# Altium footprint library custom-case.PcbLib: 380 footprints (part 5 of 24)
Each footprint in its own frame and in the unit in brackets; x right, y up, seen from the top. Pads: shape width x height; smd on the part's side, far side on the other; paste and mask are expansions set on the pad; w line width, h text height; cw(c..) or ccw(c..) is an arc to the next point about the centre after c.
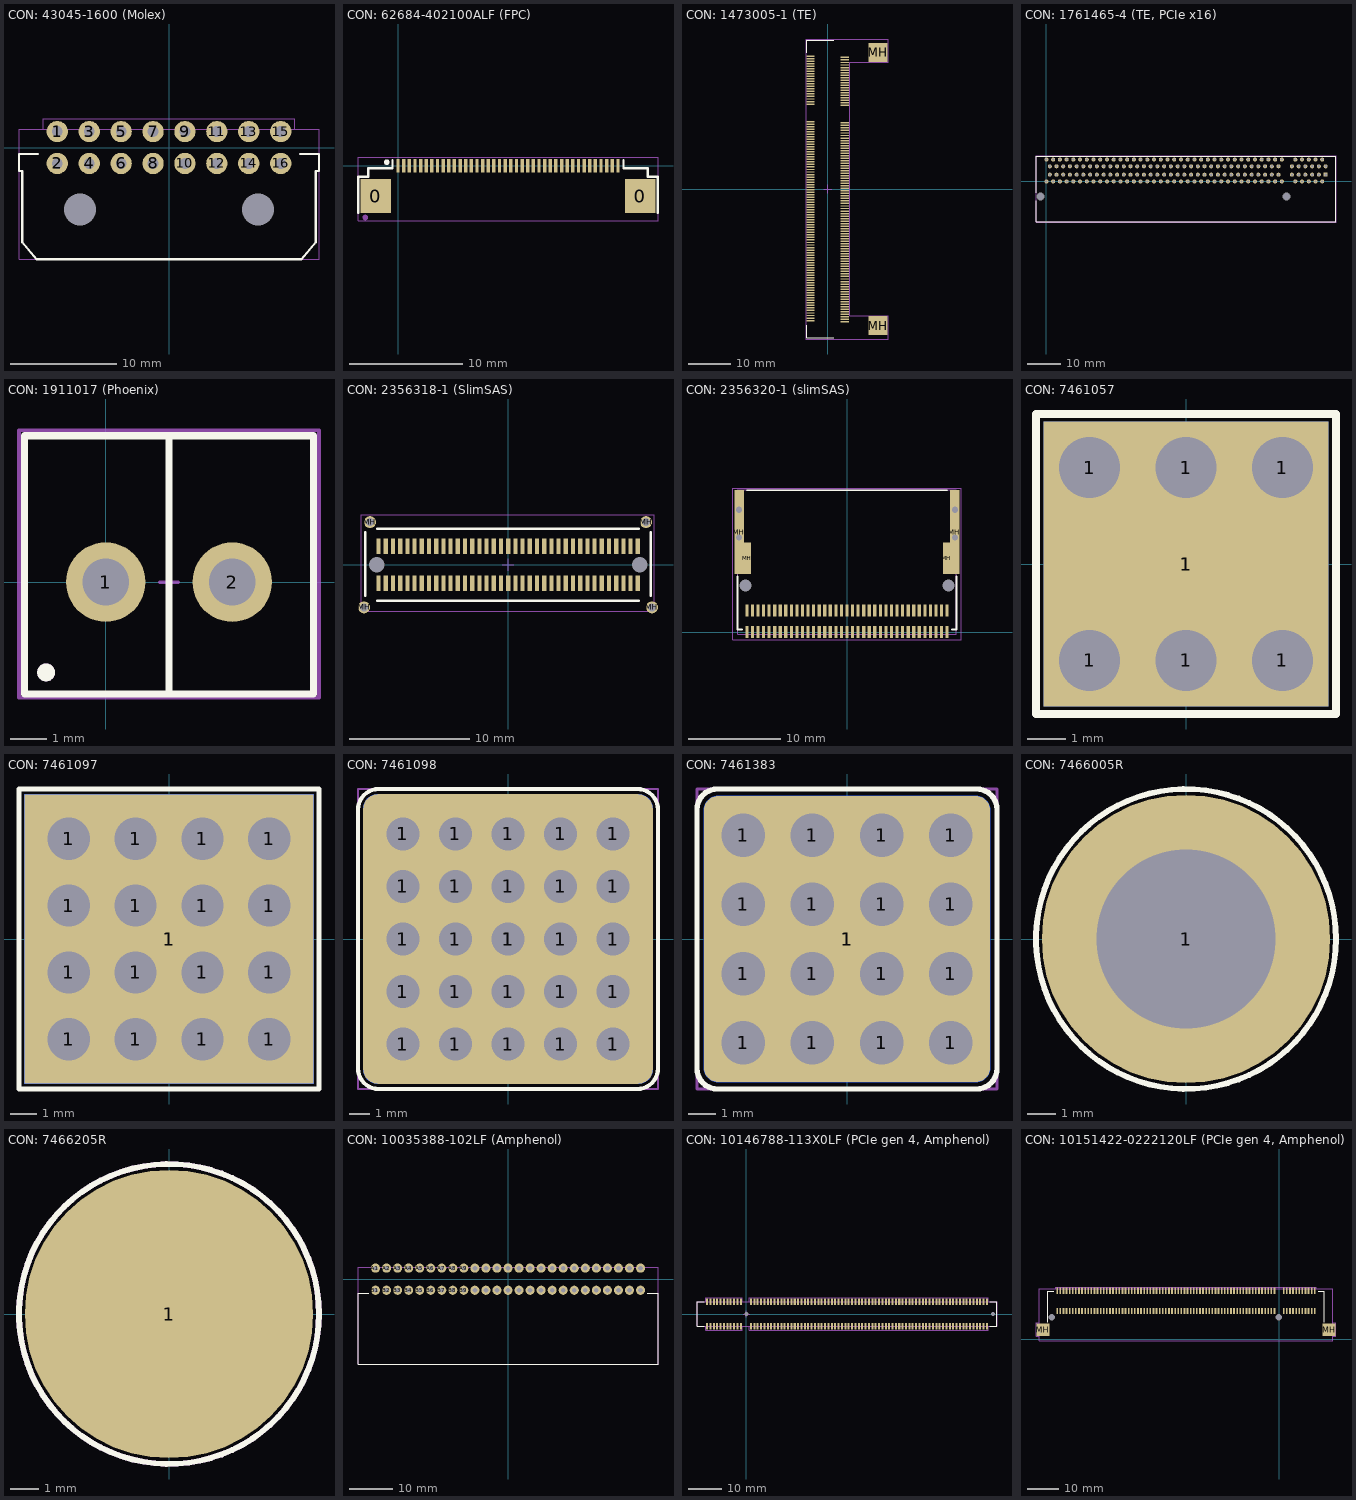
[diagram p4: the footprints below, top view; thin cyan lines are the x and y axes]

## CON: 43045-1600 (Molex) [mm]
pads (18):
  round 2 hole 1: 1(-10.5,1.5) 2(-10.5,-1.5) 3(-7.5,1.5) 4(-7.5,-1.5) 5(-4.5,1.5) 6(-4.5,-1.5) 7(-1.5,1.5) 8(-1.5,-1.5) 9(1.5,1.5) 10(1.5,-1.5) 11(4.5,1.5) 12(4.5,-1.5) 13(7.5,1.5) 14(7.5,-1.5) 15(10.5,1.5) 16(10.5,-1.5)
  round 0 hole 3: MH(-8.35,-5.82) MH(8.35,-5.82)
Top Overlay:
  lines w0.2: -12.3,-0.6 -14.1,-0.6 -14.1,-2.2 -13.8,-2.2 -13.8,-8.9 -12.45,-10.5 12.45,-10.5 13.8,-8.9 13.8,-2.2 14.1,-2.2 14.1,-0.6 12.3,-0.6
Top Assy:
  lines w0.1: -14.1,-10.5 -14.1,1.7 14.1,1.7 14.1,-10.5 -14.1,-10.5
Size Area:
  lines w0.1: -14.1,-10.5 -14.1,1.7 -11.8,1.7 -11.8,2.7 11.8,2.7 11.8,1.7 14.1,1.7 14.1,-10.5 -14.1,-10.5
3D body "430451600 v1.step": height 8.83, standoff -3.12, extent -14.075,-10.5 14.075,1.74

## CON: 62684-402100ALF (FPC) [mm]
pads (44):
  rect 2.7x3 smd: 0(-1.975,-2.7) 0(21.475,-2.7)
  rect 0.3x1.2 smd: 1(0,0) 2(0.5,0) 3(1,0) 4(1.5,0) 5(2,0) 6(2.5,0) 7(3,0) 8(3.5,0) 9(4,0) 10(4.5,0) 11(5,0) 12(5.5,0) 13(6,0) 14(6.5,0) 15(7,0) 16(7.5,0) 17(8,0) 18(8.5,0) 19(9,0) 20(9.5,0) 21(10,0) 22(10.5,0) 23(11,0) 24(11.5,0) 25(12,0) 26(12.5,0) 27(13,0) 28(13.5,0) 29(14,0) 30(14.5,0) 31(15,0) 32(15.5,0) 33(16,0) 34(16.5,0) 35(17,0) 36(17.5,0) 37(18,0) 38(18.5,0) 39(19,0) 40(19.5,0)
  round 0.5 on Mech1: ""(-2.9,-4.6)
  round 0.5 on Top Overlay: ""(-1,0.3)
Top Overlay:
  lines w0.2: -3.525,-4.2 -3.525,-1 -2.65,-1 -2.65,-0.225 -0.5,-0.225 -0.5,0.5 ; 20,0.5 20,-0.225 22.15,-0.225 22.15,-1 23.025,-1 23.025,-4.2
Size Area:
  lines w0.1: -3.55,-4.9 -3.55,0.75 23.05,0.75 23.05,-4.9 -3.55,-4.9
3D body "62684-402100ALF.SLDPRT": height 2.05, standoff 0, extent -3,-5.4 22.5,0.2

## CON: 1473005-1 (TE) [mm] "SODIMM DDR2, 200 pins"
pads (202):
  rect 2x0.35 smd: 1(-4.1,31.65) 2(4.1,31.35) 3(-4.1,31.05) 4(4.1,30.75) 5(-4.1,30.45) 6(4.1,30.15) 7(-4.1,29.85) 8(4.1,29.55) 9(-4.1,29.25) 10(4.1,28.95) 11(-4.1,28.65) 12(4.1,28.35) 13(-4.1,28.05) 14(4.1,27.75) 15(-4.1,27.45) 16(4.1,27.15) 17(-4.1,26.85) 18(4.1,26.55) 19(-4.1,26.25) 20(4.1,25.95) 21(-4.1,25.65) 22(4.1,25.35) 23(-4.1,25.05) 24(4.1,24.75) 25(-4.1,24.45) 26(4.1,24.15) 27(-4.1,23.85) 28(4.1,23.55) 29(-4.1,23.25) 30(4.1,22.95) 31(-4.1,22.65) 32(4.1,22.35) 33(-4.1,22.05) 34(4.1,21.75) 35(-4.1,21.45) 36(4.1,21.15) 37(-4.1,20.85) 38(4.1,20.55) 39(-4.1,20.25) 40(4.1,19.95) 41(-4.1,16.05) 42(4.1,15.75) 43(-4.1,15.45) 44(4.1,15.15) 45(-4.1,14.85) 46(4.1,14.55) 47(-4.1,14.25) 48(4.1,13.95) 49(-4.1,13.65) 50(4.1,13.35) 51(-4.1,13.05) 52(4.1,12.75) 53(-4.1,12.45) 54(4.1,12.15) 55(-4.1,11.85) 56(4.1,11.55) 57(-4.1,11.25) 58(4.1,10.95) 59(-4.1,10.65) 60(4.1,10.35) 61(-4.1,10.05) 62(4.1,9.75) 63(-4.1,9.45) 64(4.1,9.15) 65(-4.1,8.85) 66(4.1,8.55) 67(-4.1,8.25) 68(4.1,7.95) 69(-4.1,7.65) 70(4.1,7.35) 71(-4.1,7.05) 72(4.1,6.75) 73(-4.1,6.45) 74(4.1,6.15) 75(-4.1,5.85) 76(4.1,5.55) 77(-4.1,5.25) 78(4.1,4.95) 79(-4.1,4.65) 80(4.1,4.35) 81(-4.1,4.05) 82(4.1,3.75) 83(-4.1,3.45) 84(4.1,3.15) 85(-4.1,2.85) 86(4.1,2.55) 87(-4.1,2.25) 88(4.1,1.95) 89(-4.1,1.65) 90(4.1,1.35) 91(-4.1,1.05) 92(4.1,0.75) 93(-4.1,0.45) 94(4.1,0.15) 95(-4.1,-0.15) 96(4.1,-0.45) 97(-4.1,-0.75) 98(4.1,-1.05) 99(-4.1,-1.35) 100(4.1,-1.65) 101(-4.1,-1.95) 102(4.1,-2.25) 103(-4.1,-2.55) 104(4.1,-2.85) 105(-4.1,-3.15) 106(4.1,-3.45) 107(-4.1,-3.75) 108(4.1,-4.05) 109(-4.1,-4.35) 110(4.1,-4.65) 111(-4.1,-4.95) 112(4.1,-5.25) 113(-4.1,-5.55) 114(4.1,-5.85) 115(-4.1,-6.15) 116(4.1,-6.45) 117(-4.1,-6.75) 118(4.1,-7.05) 119(-4.1,-7.35) 120(4.1,-7.65) 121(-4.1,-7.95) 122(4.1,-8.25) 123(-4.1,-8.55) 124(4.1,-8.85) 125(-4.1,-9.15) 126(4.1,-9.45) 127(-4.1,-9.75) 128(4.1,-10.05) 129(-4.1,-10.35) 130(4.1,-10.65) 131(-4.1,-10.95) 132(4.1,-11.25) 133(-4.1,-11.55) 134(4.1,-11.85) 135(-4.1,-12.15) 136(4.1,-12.45) 137(-4.1,-12.75) 138(4.1,-13.05) 139(-4.1,-13.35) 140(4.1,-13.65) 141(-4.1,-13.95) 142(4.1,-14.25) 143(-4.1,-14.55) 144(4.1,-14.85) 145(-4.1,-15.15) 146(4.1,-15.45) 147(-4.1,-15.75) 148(4.1,-16.05) 149(-4.1,-16.35) 150(4.1,-16.65) 151(-4.1,-16.95) 152(4.1,-17.25) 153(-4.1,-17.55) 154(4.1,-17.85) 155(-4.1,-18.15) 156(4.1,-18.45) 157(-4.1,-18.75) 158(4.1,-19.05) 159(-4.1,-19.35) 160(4.1,-19.65) 161(-4.1,-19.95) 162(4.1,-20.25) 163(-4.1,-20.55) 164(4.1,-20.85) 165(-4.1,-21.15) 166(4.1,-21.45) 167(-4.1,-21.75) 168(4.1,-22.05) 169(-4.1,-22.35) 170(4.1,-22.65) 171(-4.1,-22.95) 172(4.1,-23.25) 173(-4.1,-23.55) 174(4.1,-23.85) 175(-4.1,-24.15) 176(4.1,-24.45) 177(-4.1,-24.75) 178(4.1,-25.05) 179(-4.1,-25.35) 180(4.1,-25.65) 181(-4.1,-25.95) 182(4.1,-26.25) 183(-4.1,-26.55) 184(4.1,-26.85) 185(-4.1,-27.15) 186(4.1,-27.45) 187(-4.1,-27.75) 188(4.1,-28.05) 189(-4.1,-28.35) 190(4.1,-28.65) 191(-4.1,-28.95) 192(4.1,-29.25) 193(-4.1,-29.55) 194(4.1,-29.85) 195(-4.1,-30.15) 196(4.1,-30.45) 197(-4.1,-30.75) 198(4.1,-31.05) 199(-4.1,-31.35) 200(4.1,-31.65)
  rect 4.6x4.5 smd: MH(12,-32.55) MH(12,32.55)
Top Overlay:
  lines w0.2: -5,-32.5 -5,-35.5 1.5,-35.5 ; -5,32.5 -5,35.5 1.5,35.5
Top Assy:
  lines w0.1: -5.25,-35.75 -5.25,35.75 14.45,35.75 14.45,30.15 5.25,30.15 5.25,-30.15 14.45,-30.15 14.45,-35.75 -5.25,-35.75
Size Area:
  lines w0.1: -1,0 1,0 ; 0,-1 0,1 ; -5.25,-35.75 14.45,-35.75 14.45,-30.15 5.25,-30.15 5.25,30.15 14.45,30.15 14.45,35.75 -5.25,35.75 -5.25,-35.75
3D body "c-1473005-1-j1-3d v2.step": height 5.25, standoff -0.65, extent -5,-35.75 21.05,35.75

## CON: 1761465-4 (TE, PCIe x16) [mm]
pads (166):
  rect 1.2x1.2 hole 0.7: A1(83,2)
  round 1.2 hole 0.7: A2(82,0) A3(81,2) A4(80,0) A5(79,2) A6(78,0) A7(77,2) A8(76,0) A9(75,2) A10(74,0) A11(73,2) A12(70,0) A13(69,2) A14(68,0) A15(67,2) A16(66,0) A17(65,2) A18(64,0) A19(63,2) A20(62,0) A21(61,2) A22(60,0) A23(59,2) A24(58,0) A25(57,2) A26(56,0) A27(55,2) A28(54,0) A29(53,2) A30(52,0) A31(51,2) A32(50,0) A33(49,2) A34(48,0) A35(47,2) A36(46,0) A37(45,2) A38(44,0) A39(43,2) A40(42,0) A41(41,2) A42(40,0) A43(39,2) A44(38,0) A45(37,2) A46(36,0) A47(35,2) A48(34,0) A49(33,2) A50(32,0) A51(31,2) A52(30,0) A53(29,2) A54(28,0) A55(27,2) A56(26,0) A57(25,2) A58(24,0) A59(23,2) A60(22,0) A61(21,2) A62(20,0) A63(19,2) A64(18,0) A65(17,2) A66(16,0) A67(15,2) A68(14,0) A69(13,2) A70(12,0) A71(11,2) A72(10,0) A73(9,2) A74(8,0) A75(7,2) A76(6,0) A77(5,2) A78(4,0) A79(3,2) A80(2,0) A81(1,2) A82(0,0) B1(83,4.5) B2(82,6.5) B3(81,4.5) B4(80,6.5) B5(79,4.5) B6(78,6.5) B7(77,4.5) B8(76,6.5) B9(75,4.5) B10(74,6.5) B11(73,4.5) B12(70,6.5) B13(69,4.5) B14(68,6.5) B15(67,4.5) B16(66,6.5) B17(65,4.5) B18(64,6.5) B19(63,4.5) B20(62,6.5) B21(61,4.5) B22(60,6.5) B23(59,4.5) B24(58,6.5) B25(57,4.5) B26(56,6.5) B27(55,4.5) B28(54,6.5) B29(53,4.5) B30(52,6.5) B31(51,4.5) B32(50,6.5) B33(49,4.5) B34(48,6.5) B35(47,4.5) B36(46,6.5) B37(45,4.5) B38(44,6.5) B39(43,4.5) B40(42,6.5) B41(41,4.5) B42(40,6.5) B43(39,4.5) B44(38,6.5) B45(37,4.5) B46(36,6.5) B47(35,4.5) B48(34,6.5) B49(33,4.5) B50(32,6.5) B51(31,4.5) B52(30,6.5) B53(29,4.5) B54(28,6.5) B55(27,4.5) B56(26,6.5) B57(25,4.5) B58(24,6.5) B59(23,4.5) B60(22,6.5) B61(21,4.5) B62(20,6.5) B63(19,4.5) B64(18,6.5) B65(17,4.5) B66(16,6.5) B67(15,4.5) B68(14,6.5) B69(13,4.5) B70(12,6.5) B71(11,4.5) B72(10,6.5) B73(9,4.5) B74(8,6.5) B75(7,4.5) B76(6,6.5) B77(5,4.5) B78(4,6.5) B79(3,4.5) B80(2,6.5) B81(1,4.5) B82(0,6.5)
  round 0 hole 2.35 unplated: MH(-1.8,-4.5) MH(71.35,-4.5)
Top Overlay:
  lines w0.2: -3,-5.8 -3,-12 86,-12 86,7.5 -3,7.5 -3,-3.3
Top Assy:
  lines w0.1: -3,-12 -3,7.5
3D model:
  lines w0.127: -3,-12 86,-12 86,7.5 -3,7.5
Size Area:
  lines w0.1: -3.1,-12.1 -3.1,7.6 86.1,7.6 86.1,-12.1 -3.1,-12.1
3D body "c-1761465-4-c-3d.stp": height 9.3, standoff -4.5, extent -3,-12.1 86,7.5

## CON: 1911017 (Phoenix) [mm]
pads (4):
  round 2.2 hole 1.3: 1(0,0) 2(3.5,0)
  round 0.5 on Mech1: ""(-1.65,-2.5)
  round 0.5 on Top Overlay: ""(-1.65,-2.5)
Top Overlay:
  lines w0.2: 1.75,-3.1 1.75,4.05 ; -2.25,-3.1 -2.25,4.05 5.75,4.05 5.75,-3.1 -2.25,-3.1
Top Assy:
  lines w0.1: -2.25,-3.1 -2.25,4.05 5.75,4.05 5.75,-3.1 -2.25,-3.1
Size Area:
  lines w0.1: 1.5,0 2,0 ; 1.75,-0.25 1.75,0.25 ; -2.4,-3.2 5.9,-3.2 5.9,4.2 -2.4,4.2 -2.4,-3.2
3D body "1731471.SLDPRT": height 9.31, standoff -3.29, extent -2.2,-3 5.7,4.25

## CON: 2356318-1 (SlimSAS) [mm]
pads (80):
  rect 0.35x1.3 smd mask+0.102: A1(-10.78,-1.54) A2(-10.18,-1.54) A3(-9.58,-1.54) A4(-8.98,-1.54) A5(-8.38,-1.54) A6(-7.78,-1.54) A7(-7.18,-1.54) A8(-6.58,-1.54) A9(-5.98,-1.54) A10(-5.38,-1.54) A11(-4.78,-1.54) A12(-4.18,-1.54) A13(-3.58,-1.54) A14(-2.98,-1.54) A15(-2.38,-1.54) A16(-1.78,-1.54) A17(-1.18,-1.54) A18(-0.58,-1.54) A19(0.02,-1.54) A20(0.62,-1.54) A21(1.22,-1.54) A22(1.82,-1.54) A23(2.42,-1.54) A24(3.02,-1.54) A25(3.62,-1.54) A26(4.22,-1.54) A27(4.82,-1.54) A28(5.42,-1.54) A29(6.02,-1.54) A30(6.62,-1.54) A31(7.22,-1.54) A32(7.82,-1.54) A33(8.42,-1.54) A34(9.02,-1.54) A35(9.62,-1.54) A36(10.22,-1.54) A37(10.82,-1.54) B1(-10.78,1.54) B2(-10.18,1.54) B3(-9.58,1.54) B4(-8.98,1.54) B5(-8.38,1.54) B6(-7.78,1.54) B7(-7.18,1.54) B8(-6.58,1.54) B9(-5.98,1.54) B10(-5.38,1.54) B11(-4.78,1.54) B12(-4.18,1.54) B13(-3.58,1.54) B14(-2.98,1.54) B15(-2.38,1.54) B16(-1.78,1.54) B17(-1.18,1.54) B18(-0.58,1.54) B19(0.02,1.54) B20(0.62,1.54) B21(1.22,1.54) B22(1.82,1.54) B23(2.42,1.54) B24(3.02,1.54) B25(3.62,1.54) B26(4.22,1.54) B27(4.82,1.54) B28(5.42,1.54) B29(6.02,1.54) B30(6.62,1.54) B31(7.22,1.54) B32(7.82,1.54) B33(8.42,1.54) B34(9.02,1.54) B35(9.62,1.54) B36(10.22,1.54) B37(10.82,1.54)
  round 1 hole 0.65: MH(-12,-3.55) MH(-11.5,3.55) MH(11.5,3.55) MH(12,-3.55)
  round 0 hole 1.3: MH(-10.93,0) MH(10.97,0)
Top Overlay:
  lines w0.2: -11.9,-2.6 -11.9,2.7 ; -10.9,-3 10.9,-3 ; -10.9,3 10.9,3 ; 11.9,-2.6 11.9,2.7
Top Assy:
  lines w0.1: -12.225,-3.875 -12.225,4.175 12.175,4.175 12.175,-3.85 12.15,-3.875 -12.225,-3.875
Size Area:
  lines w0.1: -0.5,0 0.5,0 ; 0,-0.5 0,0.5 ; -12.225,-3.875 -12.225,4.175 12.175,4.175 12.175,-3.85 12.15,-3.875 -12.225,-3.875
3D body "slimSAS.STEP": height 13.3, standoff -2, extent -12.2,-3.885 12.2,4.18

## CON: 2356320-1 (slimSAS) [mm] "TE manufacture"
pads (84):
  rect 0.35x1.3 smd mask+0.102: A1(10.8,2.35) A2(10.2,2.35) A3(9.6,2.35) A4(9,2.35) A5(8.4,2.35) A6(7.8,2.35) A7(7.2,2.35) A8(6.6,2.35) A9(6,2.35) A10(5.4,2.35) A11(4.8,2.35) A12(4.2,2.35) A13(3.6,2.35) A14(3,2.35) A15(2.4,2.35) A16(1.8,2.35) A17(1.2,2.35) A18(0.6,2.35) A19(0,2.35) A20(-0.6,2.35) A21(-1.2,2.35) A22(-1.8,2.35) A23(-2.4,2.35) A24(-3,2.35) A25(-3.6,2.35) A26(-4.2,2.35) A27(-4.8,2.35) A28(-5.4,2.35) A29(-6,2.35) A30(-6.6,2.35) A31(-7.2,2.35) A32(-7.8,2.35) A33(-8.4,2.35) A34(-9,2.35) A35(-9.6,2.35) A36(-10.2,2.35) A37(-10.8,2.35) B1(10.8,0) B2(10.2,0) B3(9.6,0) B4(9,0) B5(8.4,0) B6(7.8,0) B7(7.2,0) B8(6.6,0) B9(6,0) B10(5.4,0) B11(4.8,0) B12(4.2,0) B13(3.6,0) B14(3,0) B15(2.4,0) B16(1.8,0) B17(1.2,0) B18(0.6,0) B19(0,0) B20(-0.6,0) B21(-1.2,0) B22(-1.8,0) B23(-2.4,0) B24(-3,0) B25(-3.6,0) B26(-4.2,0) B27(-4.8,0) B28(-5.4,0) B29(-6,0) B30(-6.6,0) B31(-7.2,0) B32(-7.8,0) B33(-8.4,0) B34(-9,0) B35(-9.6,0) B36(-10.2,0) B37(-10.8,0)
  round 0.85 hole 0.66 mask+0.102: MH(-11.63,10.2) MH(-11.63,13.2) MH(11.63,10.2) MH(11.63,13.2)
  rect 1x9.1 smd mask+0.102: MH(-11.63,10.8) MH(11.63,10.8)
  round 0 hole 1.3 mask+0.102: MH(-10.95,5.05) MH(10.95,5.05)
  rect 0.8x3.4 smd mask+0.102: MH(-10.75,7.95) MH(10.75,7.95)
Top Overlay:
  lines w0.2: -11.8,6 -11.8,0.3 -11.3,0.3 ; -10.8,15.3 10.8,15.3 ; 11.3,0.3 11.8,0.3 11.8,6
Top Assy:
  lines w0.1: -11.8,-0.225 -11.8,15.375 11.8,15.375 11.8,-0.225 -11.8,-0.225
Size Area:
  lines w0.1: -12.3,-0.8 -12.3,15.5 12.3,15.5 12.3,-0.8 -12.3,-0.8
3D body "c-2356320-1-a-3d.stp": height 6.63, standoff -1.52, extent -11.8,-0.225 11.8,15.375

## CON: 7461057 [mm]
pads (8):
  round 2.2 hole 1.6: 1(-2.54,-2.54) 1(-2.54,2.54) 1(0,-2.54) 1(0,2.54) 1(2.54,-2.54) 1(2.54,2.54)
  rect 7.5x7.5 smd: 1(0,0)
  rect 7.5x7.5 smd far side: 1(0,0)
Top Overlay:
  lines w0.2: -3.95,-3.95 -3.95,3.95 3.95,3.95 3.95,-3.95 -3.95,-3.95
Top Assy:
  lines w0.1: -3.95,-3.95 3.95,-3.95 3.95,3.95 -3.95,3.95 -3.95,-3.95
Size Area:
  lines w0.1: -0.5,0 0.5,0 ; 0,-0.5 0,0.5 ; -3.95,-3.95 3.95,-3.95 3.95,3.95 -3.95,3.95 -3.95,-3.95
3D body "8888.STEP": height 6.05, standoff -3.45, extent -3.5,-3.5 3.5,3.5

## CON: 7461097 [mm]
pads (18):
  round 2.5 hole 1.6: 1(-3.81,-3.81) 1(-3.81,-1.27) 1(-3.81,1.27) 1(-3.81,3.81) 1(-1.27,-3.81) 1(-1.27,-1.27) 1(-1.27,1.27) 1(-1.27,3.81) 1(1.27,-3.81) 1(1.27,-1.27) 1(1.27,1.27) 1(1.27,3.81) 1(3.81,-3.81) 1(3.81,-1.27) 1(3.81,1.27) 1(3.81,3.81)
  rect 11x11 smd: 1(0,0)
  rect 11x11 smd far side: 1(0,0)
Top Overlay:
  lines w0.2: -5.7,-5.7 -5.7,5.7 5.7,5.7 5.7,-5.7 -5.7,-5.7
Top Assy:
  lines w0.1: -5.7,-5.7 -5.7,5.7 5.7,5.7 5.7,-5.7 -5.7,-5.7
Size Area:
  lines w0.1: -1,0 1,0 ; 0,-1 0,1 ; -5.7,-5.7 -5.7,5.7 5.7,5.7 5.7,-5.7 -5.7,-5.7
3D body "5555.STEP": height 10.55, standoff -3.45, extent -5,-5 5,5

## CON: 7461098 [mm]
pads (27):
  round 2.5 hole 1.6: 1(-5.08,-5.08) 1(-5.08,-2.54) 1(-5.08,0) 1(-5.08,2.54) 1(-5.08,5.08) 1(-2.54,-5.08) 1(-2.54,-2.54) 1(-2.54,0) 1(-2.54,2.54) 1(-2.54,5.08) 1(0,-5.08) 1(0,-2.54) 1(0,0) 1(0,2.54) 1(0,5.08) 1(2.54,-5.08) 1(2.54,-2.54) 1(2.54,0) 1(2.54,2.54) 1(2.54,5.08) 1(5.08,-5.08) 1(5.08,-2.54) 1(5.08,0) 1(5.08,2.54) 1(5.08,5.08)
  rrect10% 14x14 smd: 1(0,0)
  rrect10% 14x14 smd far side: 1(0,0)
Top Overlay:
  lines w0.2: -7.25,-6.25 ccw(c-6.25,-6.25) -6.25,-7.25 6.25,-7.25 ccw(c6.25,-6.25) 7.25,-6.25 7.25,6.25 ccw(c6.25,6.25) 6.25,7.25 -6.25,7.25 ccw(c-6.25,6.25) -7.25,6.25 -7.25,-6.25
Top Assy:
  lines w0.1: -6.5,6.5 6.5,6.5 6.5,-6.5 ; -6.5,6.5 -6.5,-6.5 6.5,-6.5 ; -6.5,6.5 -6.5,6.5 ; 6.5,-6.5 6.5,-6.5
Size Area:
  lines w0.1: -0.5,0 0.5,0 ; 0,-0.5 0,0.5 ; -7.25,-7.25 7.25,-7.25 7.25,7.25 -7.25,7.25 -7.25,-7.25
3D body "74610981.STEP": height 15.5, standoff -3.5, extent -6.5,-6.5 6.5,6.5

## CON: 7461383 [mm]
pads (18):
  round 2.5 hole 1.6: 1(-3.81,-3.81) 1(-3.81,-1.27) 1(-3.81,1.27) 1(-3.81,3.81) 1(-1.27,-3.81) 1(-1.27,-1.27) 1(-1.27,1.27) 1(-1.27,3.81) 1(1.27,-3.81) 1(1.27,-1.27) 1(1.27,1.27) 1(1.27,3.81) 1(3.81,-3.81) 1(3.81,-1.27) 1(3.81,1.27) 1(3.81,3.81)
  rrect10% 10.5x10.5 smd: 1(0,0)
  rrect10% 10.5x10.5 smd far side: 1(0,0)
Top Overlay:
  lines w0.2: -5.5,-4.75 ccw(c-4.75,-4.75) -4.75,-5.5 4.75,-5.5 ccw(c4.75,-4.75) 5.5,-4.75 5.5,4.75 ccw(c4.75,4.75) 4.75,5.5 -4.75,5.5 ccw(c-4.75,4.75) -5.5,4.75 -5.5,-4.75
Top Assy:
  lines w0.1: -4.5,-4.5 -4.5,4.5 ; -4.5,-4.5 -4.5,-4.5 ; -4.5,-4.5 4.5,-4.5 4.5,4.5 -4.5,4.5 ; -4.5,4.5 -4.5,4.5
Size Area:
  lines w0.1: -0.5,0 0.5,0 ; 0,-0.5 0,0.5 ; -5.5,-5.5 5.5,-5.5 5.5,5.5 -5.5,5.5 -5.5,-5.5
3D body "7461383.STEP": height 12.5, standoff -3.5, extent -4.5,-4.5 4.5,4.5

## CON: 7466005R [mm]
pads (1):
  round 10 hole 6.2: 1(0,0)
Top Overlay:
  circle w0.2: c0,0 r5.2
Top Assy:
  circle w0.1: c0,0 r5.2
Size Area:
  circle w0.1: c0,0 r5.2
  lines w0.1: -1,0 1,0 ; 0,-1 0,1
3D body "Downloads_STP_7466005 (rev1).stp": height 5.1, standoff -0.9, extent -4.491,-4.5 4.491,4.464

## CON: 7466205R [mm]
pads (1):
  round 10 smd: 1(0,0)
Top Overlay:
  circle w0.2: c0,0 r5.2
Top Assy:
  circle w0.2: c0,0 r5.2
Size Area:
  circle w0.2: c0,0 r5.2
  lines w0.1: -1,0 1,0 ; 0,-1 0,1
3D body "Downloads_STP_7466205 (rev1).stp": height 7.02, standoff 0.02, extent -4.5,-4.5 4.5,4.5

## CON: 10035388-102LF (Amphenol) [mm]
pads (50):
  round 2.1 hole 1.1: A1(-30.48,2.54) A2(-27.94,2.54) A3(-25.4,2.54) A4(-22.86,2.54) A5(-20.32,2.54) A6(-17.78,2.54) A7(-15.24,2.54) A8(-12.7,2.54) A9(-10.16,2.54) A10(-7.62,2.54) A11(-5.08,2.54) A12(-2.54,2.54) A13(0,2.54) A14(2.54,2.54) A15(5.08,2.54) A16(7.62,2.54) A17(10.16,2.54) A18(12.7,2.54) A19(15.24,2.54) A20(17.78,2.54) A21(20.32,2.54) A22(22.86,2.54) A23(25.4,2.54) A24(27.94,2.54) A25(30.48,2.54) B1(-30.48,-2.54) B2(-27.94,-2.54) B3(-25.4,-2.54) B4(-22.86,-2.54) B5(-20.32,-2.54) B6(-17.78,-2.54) B7(-15.24,-2.54) B8(-12.7,-2.54) B9(-10.16,-2.54) B10(-7.62,-2.54) B11(-5.08,-2.54) B12(-2.54,-2.54) B13(0,-2.54) B14(2.54,-2.54) B15(5.08,-2.54) B16(7.62,-2.54) B17(10.16,-2.54) B18(12.7,-2.54) B19(15.24,-2.54) B20(17.78,-2.54) B21(20.32,-2.54) B22(22.86,-2.54) B23(25.4,-2.54) B24(27.94,-2.54) B25(30.48,-2.54)
Top Overlay:
  lines w0.2: -32,-3.2 -34.5,-3.2 -34.5,-19.6 34.5,-19.6 34.5,-3.2 32,-3.2
Top Assy:
  lines w0.1: -34.5,-19.6 -34.5,2.8 34.5,2.8 34.5,-19.6 -34.5,-19.6
Size Area:
  lines w0.1: -34.5,-19.6 34.5,-19.6 34.5,2.8 -34.5,2.8 -34.5,-19.6
3D body "10035388-102LFc v3.step": height 8.5, standoff -3.5, extent -34.52,-19.585 34.52,2.795

## CON: 10146788-113X0LF (PCIe gen 4, Amphenol) [mm]
pads (166):
  rect 0.6x2 smd: A1(-11.65,3.6) A2(-10.65,3.6) A3(-9.65,3.6) A4(-8.65,3.6) A5(-7.65,3.6) A6(-6.65,3.6) A7(-5.65,3.6) A8(-4.65,3.6) A9(-3.65,3.6) A10(-2.65,3.6) A11(-1.65,3.6) A12(1.35,3.6) A13(2.35,3.6) A14(3.35,3.6) A15(4.35,3.6) A16(5.35,3.6) A17(6.35,3.6) A18(7.35,3.6) A19(8.35,3.6) A20(9.35,3.6) A21(10.35,3.6) A22(11.35,3.6) A23(12.35,3.6) A24(13.35,3.6) A25(14.35,3.6) A26(15.35,3.6) A27(16.35,3.6) A28(17.35,3.6) A29(18.35,3.6) A30(19.35,3.6) A31(20.35,3.6) A32(21.35,3.6) A33(22.35,3.6) A34(23.35,3.6) A35(24.35,3.6) A36(25.35,3.6) A37(26.35,3.6) A38(27.35,3.6) A39(28.35,3.6) A40(29.35,3.6) A41(30.35,3.6) A42(31.35,3.6) A43(32.35,3.6) A44(33.35,3.6) A45(34.35,3.6) A46(35.35,3.6) A47(36.35,3.6) A48(37.35,3.6) A49(38.35,3.6) A50(39.35,3.6) A51(40.35,3.6) A52(41.35,3.6) A53(42.35,3.6) A54(43.35,3.6) A55(44.35,3.6) A56(45.35,3.6) A57(46.35,3.6) A58(47.35,3.6) A59(48.35,3.6) A60(49.35,3.6) A61(50.35,3.6) A62(51.35,3.6) A63(52.35,3.6) A64(53.35,3.6) A65(54.35,3.6) A66(55.35,3.6) A67(56.35,3.6) A68(57.35,3.6) A69(58.35,3.6) A70(59.35,3.6) A71(60.35,3.6) A72(61.35,3.6) A73(62.35,3.6) A74(63.35,3.6) A75(64.35,3.6) A76(65.35,3.6) A77(66.35,3.6) A78(67.35,3.6) A79(68.35,3.6) A80(69.35,3.6) A81(70.35,3.6) A82(71.35,3.6) B1(-11.65,-3.6) B2(-10.65,-3.6) B3(-9.65,-3.6) B4(-8.65,-3.6) B5(-7.65,-3.6) B6(-6.65,-3.6) B7(-5.65,-3.6) B8(-4.65,-3.6) B9(-3.65,-3.6) B10(-2.65,-3.6) B11(-1.65,-3.6) B12(1.35,-3.6) B13(2.35,-3.6) B14(3.35,-3.6) B15(4.35,-3.6) B16(5.35,-3.6) B17(6.35,-3.6) B18(7.35,-3.6) B19(8.35,-3.6) B20(9.35,-3.6) B21(10.35,-3.6) B22(11.35,-3.6) B23(12.35,-3.6) B24(13.35,-3.6) B25(14.35,-3.6) B26(15.35,-3.6) B27(16.35,-3.6) B28(17.35,-3.6) B29(18.35,-3.6) B30(19.35,-3.6) B31(20.35,-3.6) B32(21.35,-3.6) B33(22.35,-3.6) B34(23.35,-3.6) B35(24.35,-3.6) B36(25.35,-3.6) B37(26.35,-3.6) B38(27.35,-3.6) B39(28.35,-3.6) B40(29.35,-3.6) B41(30.35,-3.6) B42(31.35,-3.6) B43(32.35,-3.6) B44(33.35,-3.6) B45(34.35,-3.6) B46(35.35,-3.6) B47(36.35,-3.6) B48(37.35,-3.6) B49(38.35,-3.6) B50(39.35,-3.6) B51(40.35,-3.6) B52(41.35,-3.6) B53(42.35,-3.6) B54(43.35,-3.6) B55(44.35,-3.6) B56(45.35,-3.6) B57(46.35,-3.6) B58(47.35,-3.6) B59(48.35,-3.6) B60(49.35,-3.6) B61(50.35,-3.6) B62(51.35,-3.6) B63(52.35,-3.6) B64(53.35,-3.6) B65(54.35,-3.6) B66(55.35,-3.6) B67(56.35,-3.6) B68(57.35,-3.6) B69(58.35,-3.6) B70(59.35,-3.6) B71(60.35,-3.6) B72(61.35,-3.6) B73(62.35,-3.6) B74(63.35,-3.6) B75(64.35,-3.6) B76(65.35,-3.6) B77(66.35,-3.6) B78(67.35,-3.6) B79(68.35,-3.6) B80(69.35,-3.6) B81(70.35,-3.6) B82(71.35,-3.6)
  round 0 hole 1.2 mask+0.1: MH(0,0) MH(73.15,0)
Top Overlay:
  lines w0.2: -12.5,-3.7 -14.65,-3.7 -14.65,3.7 -12.5,3.7 ; 72.2,-3.7 74.35,-3.7 74.35,3.7 72.2,3.7
Top Assy:
  lines w0.1: -14.65,-3.7 -14.65,3.7 74.35,3.7 74.35,-3.7 -14.65,-3.7
Size Area:
  lines w0.1: -1,0 1,0 ; 0,-1 0,1 ; -14.65,-3.7 -14.65,3.7 -12.1,3.7 -12.1,4.75 -1.2,4.75 -1.2,3.7 0.9,3.7 0.9,4.75 71.8,4.75 71.8,3.7 74.35,3.7 74.35,-3.7 71.8,-3.7 71.8,-4.75 0.9,-4.75 0.9,-3.7 -1.2,-3.7 -1.2,-4.75 -12.1,-4.75 -12.1,-3.7 -14.65,-3.7
3D body "10146788-113X0LF v2.step": height 9, standoff -0.95, extent -14.65,-5.1 74.35,4.1

## CON: 10151422-0222120LF (PCIe gen 4, Amphenol) [mm]
pads (168):
  rect 0.55x2 smd: A1(11.5,9.2) A2(10.5,9.2) A3(9.5,9.2) A4(8.5,9.2) A5(7.5,9.2) A6(6.5,9.2) A7(5.5,9.2) A8(4.5,9.2) A9(3.5,9.2) A10(2.5,9.2) A11(1.5,9.2) A12(-1.5,9.2) A13(-2.5,9.2) A14(-3.5,9.2) A15(-4.5,9.2) A16(-5.5,9.2) A17(-6.5,9.2) A18(-7.5,9.2) A19(-8.5,9.2) A20(-9.5,9.2) A21(-10.5,9.2) A22(-11.5,9.2) A23(-12.5,9.2) A24(-13.5,9.2) A25(-14.5,9.2) A26(-15.5,9.2) A27(-16.5,9.2) A28(-17.5,9.2) A29(-18.5,9.2) A30(-19.5,9.2) A31(-20.5,9.2) A32(-21.5,9.2) A33(-22.5,9.2) A34(-23.5,9.2) A35(-24.5,9.2) A36(-25.5,9.2) A37(-26.5,9.2) A38(-27.5,9.2) A39(-28.5,9.2) A40(-29.5,9.2) A41(-30.5,9.2) A42(-31.5,9.2) A43(-32.5,9.2) A44(-33.5,9.2) A45(-34.5,9.2) A46(-35.5,9.2) A47(-36.5,9.2) A48(-37.5,9.2) A49(-38.5,9.2) A50(-39.5,9.2) A51(-40.5,9.2) A52(-41.5,9.2) A53(-42.5,9.2) A54(-43.5,9.2) A55(-44.5,9.2) A56(-45.5,9.2) A57(-46.5,9.2) A58(-47.5,9.2) A59(-48.5,9.2) A60(-49.5,9.2) A61(-50.5,9.2) A62(-51.5,9.2) A63(-52.5,9.2) A64(-53.5,9.2) A65(-54.5,9.2) A66(-55.5,9.2) A67(-56.5,9.2) A68(-57.5,9.2) A69(-58.5,9.2) A70(-59.5,9.2) A71(-60.5,9.2) A72(-61.5,9.2) A73(-62.5,9.2) A74(-63.5,9.2) A75(-64.5,9.2) A76(-65.5,9.2) A77(-66.5,9.2) A78(-67.5,9.2) A79(-68.5,9.2) A80(-69.5,9.2) A81(-70.5,9.2) A82(-71.5,9.2) B1(11.5,15.7) B2(10.5,15.7) B3(9.5,15.7) B4(8.5,15.7) B5(7.5,15.7) B6(6.5,15.7) B7(5.5,15.7) B8(4.5,15.7) B9(3.5,15.7) B10(2.5,15.7) B11(1.5,15.7) B12(-1.5,15.7) B13(-2.5,15.7) B14(-3.5,15.7) B15(-4.5,15.7) B16(-5.5,15.7) B17(-6.5,15.7) B18(-7.5,15.7) B19(-8.5,15.7) B20(-9.5,15.7) B21(-10.5,15.7) B22(-11.5,15.7) B23(-12.5,15.7) B24(-13.5,15.7) B25(-14.5,15.7) B26(-15.5,15.7) B27(-16.5,15.7) B28(-17.5,15.7) B29(-18.5,15.7) B30(-19.5,15.7) B31(-20.5,15.7) B32(-21.5,15.7) B33(-22.5,15.7) B34(-23.5,15.7) B35(-24.5,15.7) B36(-25.5,15.7) B37(-26.5,15.7) B38(-27.5,15.7) B39(-28.5,15.7) B40(-29.5,15.7) B41(-30.5,15.7) B42(-31.5,15.7) B43(-32.5,15.7) B44(-33.5,15.7) B45(-34.5,15.7) B46(-35.5,15.7) B47(-36.5,15.7) B48(-37.5,15.7) B49(-38.5,15.7) B50(-39.5,15.7) B51(-40.5,15.7) B52(-41.5,15.7) B53(-42.5,15.7) B54(-43.5,15.7) B55(-44.5,15.7) B56(-45.5,15.7) B57(-46.5,15.7) B58(-47.5,15.7) B59(-48.5,15.7) B60(-49.5,15.7) B61(-50.5,15.7) B62(-51.5,15.7) B63(-52.5,15.7) B64(-53.5,15.7) B65(-54.5,15.7) B66(-55.5,15.7) B67(-56.5,15.7) B68(-57.5,15.7) B69(-58.5,15.7) B70(-59.5,15.7) B71(-60.5,15.7) B72(-61.5,15.7) B73(-62.5,15.7) B74(-63.5,15.7) B75(-64.5,15.7) B76(-65.5,15.7) B77(-66.5,15.7) B78(-67.5,15.7) B79(-68.5,15.7) B80(-69.5,15.7) B81(-70.5,15.7) B82(-71.5,15.7)
  rect 4.2x4 smd: MH(-76.1,3.2) MH(16.1,3.2)
  round 0 hole 2.1: MH(-73.3,7.2) MH(-0.15,7.2)
Top Overlay:
  lines w0.2: -74.525,5.5 -74.525,15.55 -72.625,15.55 ; 12.625,15.55 14.525,15.55 14.525,5.5
Top Assy:
  lines w0.1: -77.3,-0.425 -77.3,16.325 17.3,16.325 17.3,-0.425 -77.3,-0.425
Size Area:
  lines w0.1: -78.35,1.05 -78.35,5.35 -77.3,5.35 -77.3,16.325 -71.925,16.325 -71.925,16.85 11.925,16.85 11.925,16.325 17.3,16.325 17.3,5.35 18.35,5.35 18.35,1.05 17.3,1.05 17.3,-0.425 -77.3,-0.425 -77.3,1.05 -78.35,1.05
3D body "pcie.STEP": height 9.85, standoff -2.25, extent -77.298,-0.425 17.308,16.325